# Altium footprint library 集大电协1.5.PcbLib: 273 footprints (part 18 of 18)
Each footprint in its own frame and in the unit in brackets; x right, y up, seen from the top. Pads: shape width x height; smd on the part's side, far side on the other; paste and mask are expansions set on the pad; w line width, h text height; cw(c..) or ccw(c..) is an arc to the next point about the centre after c.
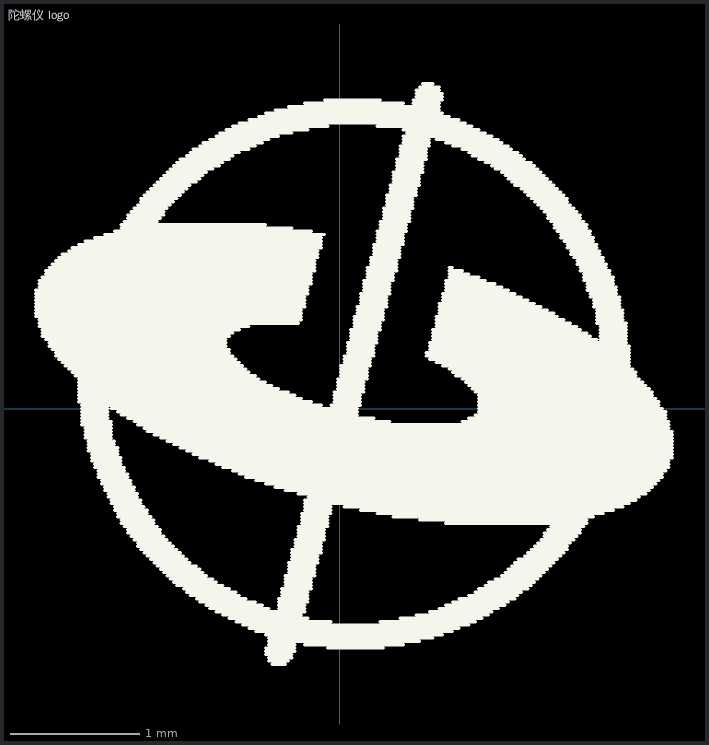
[diagram p17: the footprint, top view; thin cyan lines are the x and y axes]

## 陀螺仪 logo [mm]
Top Overlay:
  drawing of 476 lines, arcs and shapes, not listed